# Altium schematic symbol library FPGA_Xilinx_Virtex6.SchLib: 28 symbols (part 16 of 21)
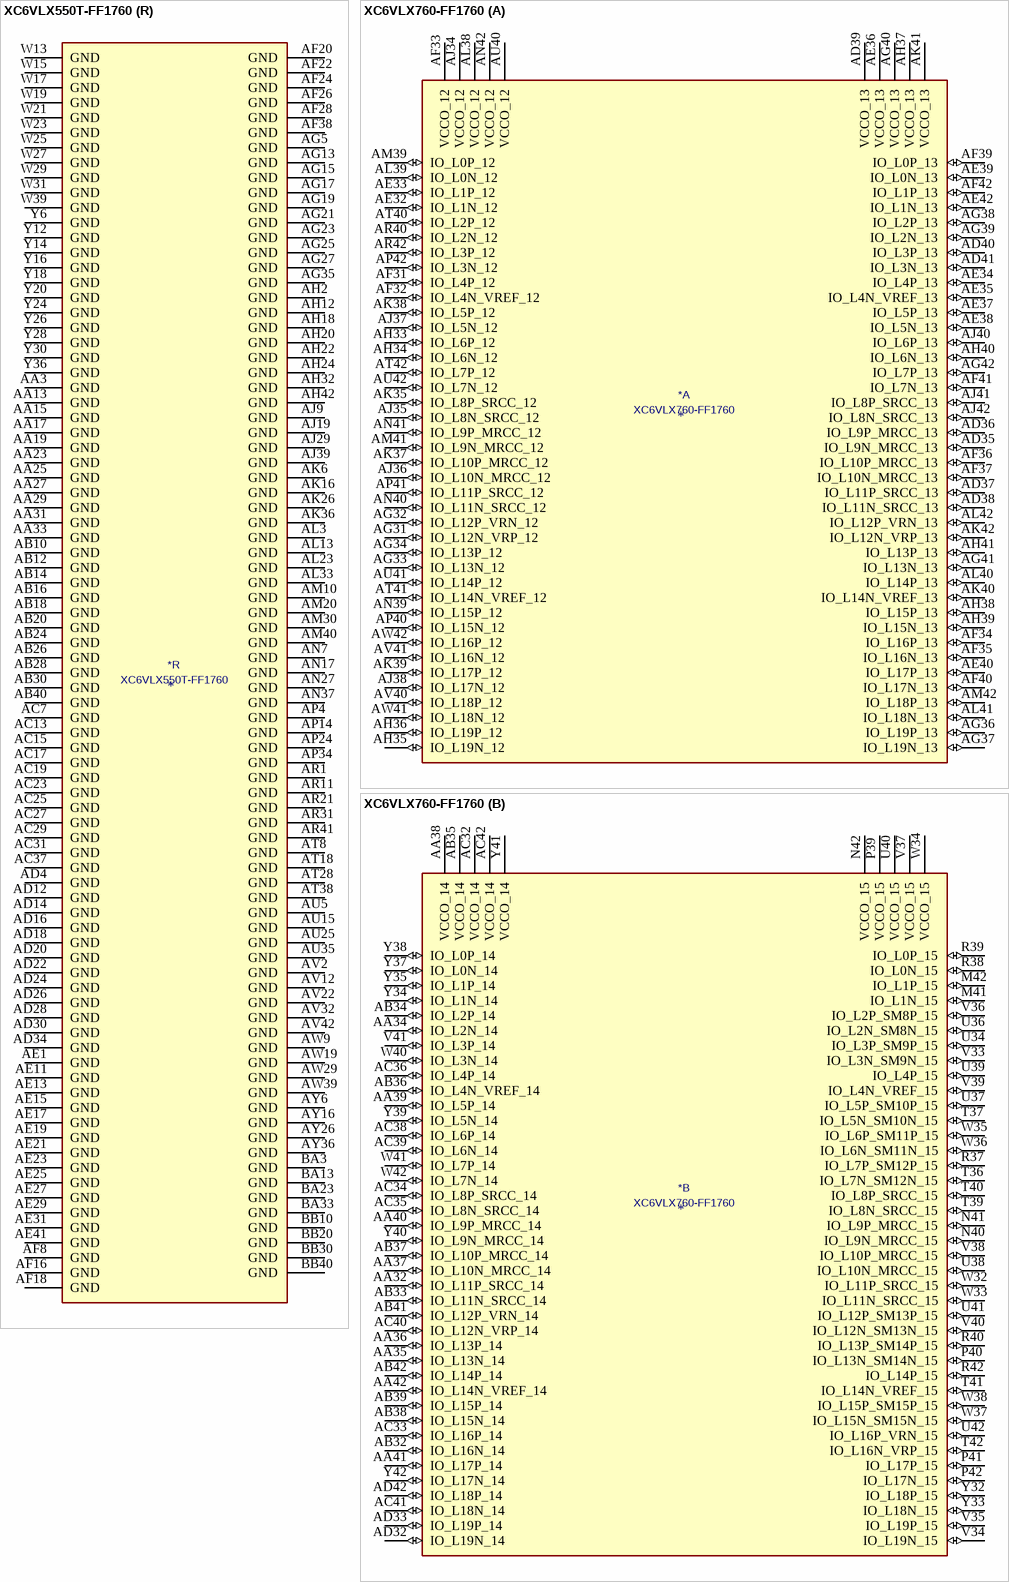
[diagram p116: symbols XC6VLX550T-FF1760 to XC6VLX760-FF1760]

## XC6VLX550T-FF1760
designator *  value XC6VLX550T-FF1760
ki_keywords: FPGA; ki_description: Virtex 6 LXT 550 XC6VLX550T-FF1760
part A pins: AD35 IO_L9N_MRCC_13 (io), AD36 IO_L9P_MRCC_13 (io), AD37 IO_L11P_SRCC_13 (io), AD38 IO_L11N_SRCC_13 (io), AD39 VCCO_13 (power), AD40 IO_L3P_13 (io), AD41 IO_L3N_13 (io), AE32 IO_L1N_12 (io), AE33 IO_L1P_12 (io), AE34 IO_L4P_13 (io), AE35 IO_L4N_VREF_13 (io), AE36 VCCO_13 (power), AE37 IO_L5P_13 (io), AE38 IO_L5N_13 (io), AE39 IO_L0N_13 (io), AE40 IO_L17P_13 (io), AE42 IO_L1N_13 (io), AF31 IO_L4P_12 (io), AF32 IO_L4N_VREF_12 (io), AF33 VCCO_12 (power), AF34 IO_L16P_13 (io), AF35 IO_L16N_13 (io), AF36 IO_L10P_MRCC_13 (io), AF37 IO_L10N_MRCC_13 (io), AF39 IO_L0P_13 (io), AF40 IO_L17N_13 (io), AF41 IO_L7N_13 (io), AF42 IO_L1P_13 (io), AG31 IO_L12N_VRP_12 (io), AG32 IO_L12P_VRN_12 (io), AG33 IO_L13N_12 (io), AG34 IO_L13P_12 (io), AG36 IO_L19P_13 (io), AG37 IO_L19N_13 (io), AG38 IO_L2P_13 (io), AG39 IO_L2N_13 (io), AG40 VCCO_13 (power), AG41 IO_L13N_13 (io), AG42 IO_L7P_13 (io), AH33 IO_L6P_12 (io), AH34 IO_L6N_12 (io), AH35 IO_L19N_12 (io), AH36 IO_L19P_12 (io), AH37 VCCO_13 (power), AH38 IO_L15P_13 (io), AH39 IO_L15N_13 (io), AH40 IO_L6N_13 (io), AH41 IO_L13P_13 (io), AJ34 VCCO_12 (power), AJ35 IO_L8N_SRCC_12 (io), AJ36 IO_L10N_MRCC_12 (io), AJ37 IO_L5N_12 (io), AJ38 IO_L17N_12 (io), AJ40 IO_L6P_13 (io), AJ41 IO_L8P_SRCC_13 (io), AJ42 IO_L8N_SRCC_13 (io), AK35 IO_L8P_SRCC_12 (io), AK37 IO_L10P_MRCC_12 (io), AK38 IO_L5P_12 (io), AK39 IO_L17P_12 (io), AK40 IO_L14N_VREF_13 (io), AK41 VCCO_13 (power), AK42 IO_L12N_VRP_13 (io), AL38 VCCO_12 (power), AL39 IO_L0N_12 (io), AL40 IO_L14P_13 (io), AL41 IO_L18N_13 (io), AL42 IO_L12P_VRN_13 (io), AM39 IO_L0P_12 (io), AM41 IO_L9N_MRCC_12 (io), AM42 IO_L18P_13 (io), AN39 IO_L15P_12 (io), AN40 IO_L11N_SRCC_12 (io), AN41 IO_L9P_MRCC_12 (io), AN42 VCCO_12 (power), AP40 IO_L15N_12 (io), AP41 IO_L11P_SRCC_12 (io), AP42 IO_L3N_12 (io), AR40 IO_L2N_12 (io), AR42 IO_L3P_12 (io), AT40 IO_L2P_12 (io), AT41 IO_L14N_VREF_12 (io), AT42 IO_L7P_12 (io), AU40 VCCO_12 (power), AU41 IO_L14P_12 (io), AU42 IO_L7N_12 (io), AV40 IO_L18P_12 (io), AV41 IO_L16N_12 (io), AW41 IO_L18N_12 (io), AW42 IO_L16P_12 (io)
part B pins: AA32 IO_L11P_SRCC_14 (io), AA34 IO_L2N_14 (io), AA35 IO_L13N_14 (io), AA36 IO_L13P_14 (io), AA37 IO_L10N_MRCC_14 (io), AA38 VCCO_14 (power), AA39 IO_L5P_14 (io), AA40 IO_L9P_MRCC_14 (io), AA41 IO_L17P_14 (io), AA42 IO_L14N_VREF_14 (io), AB32 IO_L16N_14 (io), AB33 IO_L11N_SRCC_14 (io), AB34 IO_L2P_14 (io), AB35 VCCO_14 (power), AB36 IO_L4N_VREF_14 (io), AB37 IO_L10P_MRCC_14 (io), AB38 IO_L15N_14 (io), AB39 IO_L15P_14 (io), AB41 IO_L12P_VRN_14 (io), AB42 IO_L14P_14 (io), AC32 VCCO_14 (power), AC33 IO_L16P_14 (io), AC34 IO_L8P_SRCC_14 (io), AC35 IO_L8N_SRCC_14 (io), AC36 IO_L4P_14 (io), AC38 IO_L6P_14 (io), AC39 IO_L6N_14 (io), AC40 IO_L12N_VRP_14 (io), AC41 IO_L18N_14 (io), AC42 VCCO_14 (power), AD32 IO_L19N_14 (io), AD33 IO_L19P_14 (io), AD42 IO_L18P_14 (io), M41 IO_L1N_15 (io), M42 IO_L1P_15 (io), N40 IO_L9N_MRCC_15 (io), N41 IO_L9P_MRCC_15 (io), N42 VCCO_15 (power), P39 VCCO_15 (power), P40 IO_L13N_SM14N_15 (io), P41 IO_L17P_15 (io), P42 IO_L17N_15 (io), R37 IO_L7P_SM12P_15 (io), R38 IO_L0N_15 (io), R39 IO_L0P_15 (io), R40 IO_L13P_SM14P_15 (io), R42 IO_L14P_15 (io), T36 IO_L7N_SM12N_15 (io), T37 IO_L5N_SM10N_15 (io), T39 IO_L8N_SRCC_15 (io), T40 IO_L8P_SRCC_15 (io), T41 IO_L14N_VREF_15 (io), T42 IO_L16N_VRP_15 (io), U34 IO_L3P_SM9P_15 (io), U36 IO_L2N_SM8N_15 (io), U37 IO_L5P_SM10P_15 (io), U38 IO_L10N_MRCC_15 (io), U39 IO_L4P_15 (io), U40 VCCO_15 (power), U41 IO_L12P_SM13P_15 (io), U42 IO_L16P_VRN_15 (io), V33 IO_L3N_SM9N_15 (io), V34 IO_L19N_15 (io), V35 IO_L19P_15 (io), V36 IO_L2P_SM8P_15 (io), V37 VCCO_15 (power), V38 IO_L10P_MRCC_15 (io), V39 IO_L4N_VREF_15 (io), V40 IO_L12N_SM13N_15 (io), V41 IO_L3P_14 (io), W32 IO_L11P_SRCC_15 (io), W33 IO_L11N_SRCC_15 (io), W34 VCCO_15 (power), W35 IO_L6P_SM11P_15 (io), W36 IO_L6N_SM11N_15 (io), W37 IO_L15N_SM15N_15 (io), W38 IO_L15P_SM15P_15 (io), W40 IO_L3N_14 (io), W41 IO_L7P_14 (io), W42 IO_L7N_14 (io), Y32 IO_L18P_15 (io), Y33 IO_L18N_15 (io), Y34 IO_L1N_14 (io), Y35 IO_L1P_14 (io), Y37 IO_L0N_14 (io), Y38 IO_L0P_14 (io), Y39 IO_L5N_14 (io), Y40 IO_L9N_MRCC_14 (io), Y41 VCCO_14 (power), Y42 IO_L17N_14 (io)
part C pins: A40 IO_L3N_17 (io), A41 IO_L3P_17 (io), B39 IO_L1P_17 (io), B41 IO_L7P_17 (io), B42 IO_L7N_17 (io), C39 IO_L1N_17 (io), C40 IO_L9N_MRCC_17 (io), C41 IO_L9P_MRCC_17 (io), C42 VCCO_17 (power), D39 VCCO_17 (power), D40 IO_L14P_17 (io), D41 IO_L16N_17 (io), D42 IO_L16P_17 (io), E38 IO_L5N_17 (io), E39 IO_L5P_17 (io), E40 IO_L14N_VREF_17 (io), E42 IO_L18N_17 (io), F39 IO_L2N_17 (io), F40 IO_L2P_17 (io), F41 IO_L18P_17 (io), F42 IO_L13N_16 (io), G37 IO_L0P_17 (io), G38 IO_L4N_VREF_17 (io), G39 IO_L12N_VRP_17 (io), G40 VCCO_16 (power), G41 IO_L11N_SRCC_16 (io), G42 IO_L13P_16 (io), H36 IO_L0N_17 (io), H37 VCCO_17 (power), H38 IO_L4P_17 (io), H39 IO_L12P_VRN_17 (io), H40 IO_L11P_SRCC_16 (io), H41 IO_L19N_16 (io), J34 VCCO_17 (power), J35 IO_L17N_17 (io), J36 IO_L19P_17 (io), J37 IO_L10N_MRCC_17 (io), J38 IO_L10P_MRCC_17 (io), J40 IO_L9P_MRCC_16 (io), J41 IO_L16N_16 (io), J42 IO_L19P_16 (io), K34 IO_L17P_17 (io), K35 IO_L19N_17 (io), K37 IO_L15P_17 (io), K38 IO_L0P_16 (io), K39 IO_L9N_MRCC_16 (io), K40 IO_L6N_16 (io), K41 VCCO_16 (power), K42 IO_L16P_16 (io), L34 IO_L11N_SRCC_17 (io), L35 IO_L6P_17 (io), L36 IO_L15N_17 (io), L37 IO_L0N_16 (io), L38 VCCO_16 (power), L39 IO_L4N_VREF_16 (io), L40 IO_L6P_16 (io), L41 IO_L18N_16 (io), L42 IO_L18P_16 (io), M33 IO_L11P_SRCC_17 (io), M34 IO_L6N_17 (io), M35 VCCO_17 (power), M36 IO_L3P_16 (io), M37 IO_L10N_MRCC_16 (io), M38 IO_L10P_MRCC_16 (io), M39 IO_L4P_16 (io), N32 VCCO_17 (power), N33 IO_L13P_17 (io), N34 IO_L8N_SRCC_17 (io), N35 IO_L3N_16 (io), N36 IO_L5N_16 (io), N38 IO_L12N_VRP_16 (io), N39 IO_L12P_VRN_16 (io), P32 IO_L13N_17 (io), P33 IO_L8P_SRCC_17 (io), P35 IO_L17N_16 (io), P36 IO_L5P_16 (io), P37 IO_L15N_16 (io), P38 IO_L15P_16 (io), R32 IO_L1N_16 (io), R33 IO_L1P_16 (io), R34 IO_L17P_16 (io), R35 IO_L2N_16 (io), R36 VCCO_16 (power), T31 IO_L7P_16 (io), T32 IO_L7N_16 (io), T33 VCCO_16 (power), T34 IO_L8N_SRCC_16 (io), T35 IO_L2P_16 (io), U31 IO_L14P_16 (io), U32 IO_L14N_VREF_16 (io), U33 IO_L8P_SRCC_16 (io)
part D pins: AH26 IO_L4N_VREF_21 (io), AJ22 IO_L8N_SRCC_21 (io), AJ23 IO_L8P_SRCC_21 (io), AJ24 VCCO_21 (power), AJ25 IO_L12N_VRP_21 (io), AJ26 IO_L4P_21 (io), AK22 IO_L16N_21 (io), AK23 IO_L16P_21 (io), AK24 IO_L19P_21 (io), AK25 IO_L12P_VRN_21 (io), AL24 IO_L15P_21 (io), AL25 IO_L19N_21 (io), AM23 IO_L18P_21 (io), AM24 IO_L15N_21 (io), AM25 VCCO_21 (power), AM26 IO_L17N_21 (io), AN23 IO_L18N_21 (io), AN24 IO_L14P_21 (io), AN25 IO_L14N_VREF_21 (io), AN26 IO_L17P_21 (io), AP23 IO_L11P_SRCC_20 (io), AP25 IO_L9P_MRCC_20 (io), AP26 IO_L13P_21 (io), AP27 IO_L13N_21 (io), AR23 IO_L11N_SRCC_20 (io), AR24 IO_L2P_20 (io), AR25 IO_L9N_MRCC_20 (io), AR26 VCCO_21 (power), AR27 IO_L11N_SRCC_21 (io), AT22 IO_L10P_MRCC_20 (io), AT23 VCCO_20 (power), AT24 IO_L15P_20 (io), AT25 IO_L2N_20 (io), AT26 IO_L10N_MRCC_21 (io), AT27 IO_L11P_SRCC_21 (io), AU22 IO_L10N_MRCC_20 (io), AU23 IO_L19P_20 (io), AU24 IO_L15N_20 (io), AU26 IO_L10P_MRCC_21 (io), AU27 IO_L5P_21 (io), AU28 IO_L5N_21 (io), AU29 IO_L0P_21 (io), AV23 IO_L19N_20 (io), AV24 IO_L5P_20 (io), AV25 IO_L0N_20 (io), AV26 IO_L0P_20 (io), AV27 VCCO_21 (power), AV28 IO_L6N_21 (io), AV29 IO_L0N_21 (io), AW22 IO_L6P_20 (io), AW23 IO_L6N_20 (io), AW24 VCCO_20 (power), AW25 IO_L5N_20 (io), AW26 IO_L1N_20 (io), AW27 IO_L6P_21 (io), AW28 IO_L9P_MRCC_21 (io), AW30 IO_L2N_21 (io), AY21 VCCO_20 (power), AY22 IO_L16P_20 (io), AY23 IO_L16N_20 (io), AY24 IO_L8N_SRCC_20 (io), AY25 IO_L4N_VREF_20 (io), AY27 IO_L1P_20 (io), AY28 IO_L3N_20 (io), AY29 IO_L9N_MRCC_21 (io), AY30 IO_L2P_21 (io), AY31 VCCO_21 (power), AY32 IO_L1N_21 (io), BA21 IO_L12P_VRN_20 (io), BA22 IO_L18P_20 (io), BA24 IO_L8P_SRCC_20 (io), BA25 IO_L4P_20 (io), BA26 IO_L13N_20 (io), BA27 IO_L17N_20 (io), BA28 VCCO_20 (power), BA29 IO_L3P_20 (io), BA30 IO_L7N_21 (io), BA31 IO_L3P_21 (io), BA32 IO_L1P_21 (io), BB21 IO_L12N_VRP_20 (io), BB22 IO_L18N_20 (io), BB23 IO_L14P_20 (io), BB24 IO_L14N_VREF_20 (io), BB25 VCCO_20 (power), BB26 IO_L13P_20 (io), BB27 IO_L17P_20 (io), BB28 IO_L7N_20 (io), BB29 IO_L7P_20 (io), BB31 IO_L7P_21 (io), BB32 IO_L3N_21 (io)
part E pins: AJ27 IO_L19N_22 (io), AJ28 IO_L0P_22 (io), AK27 IO_L19P_22 (io), AK28 IO_L0N_22 (io), AL26 IO_L18P_22 (io), AL27 IO_L16P_22 (io), AL28 VCCO_22 (power), AM27 IO_L18N_22 (io), AM28 IO_L16N_22 (io), AM29 IO_L17P_22 (io), AM31 IO_L6P_23 (io), AM32 IO_L6N_23 (io), AN28 IO_L14P_22 (io), AN29 IO_L17N_22 (io), AN30 IO_L18P_23 (io), AN31 IO_L18N_23 (io), AN32 VCCO_23 (power), AN33 IO_L13N_23 (io), AP28 IO_L14N_VREF_22 (io), AP29 VCCO_22 (power), AP30 IO_L7N_22 (io), AP31 IO_L7P_22 (io), AP32 IO_L16P_23 (io), AP33 IO_L13P_23 (io), AR28 IO_L13P_22 (io), AR29 IO_L11N_SRCC_22 (io), AR30 IO_L9P_MRCC_22 (io), AR32 IO_L16N_23 (io), AR33 IO_L14P_23 (io), AR34 IO_L17N_23 (io), AT29 IO_L13N_22 (io), AT30 IO_L11P_SRCC_22 (io), AT31 IO_L9N_MRCC_22 (io), AT32 IO_L4P_22 (io), AT33 VCCO_23 (power), AT34 IO_L14N_VREF_23 (io), AT35 IO_L17P_23 (io), AU30 VCCO_22 (power), AU31 IO_L15N_22 (io), AU32 IO_L6N_22 (io), AU33 IO_L4N_VREF_22 (io), AU34 IO_L5N_22 (io), AU36 IO_L10P_MRCC_23 (io), AU37 IO_L10N_MRCC_23 (io), AU38 IO_L5N_23 (io), AU39 IO_L0P_23 (io), AV30 IO_L12P_VRN_22 (io), AV31 IO_L15P_22 (io), AV33 IO_L6P_22 (io), AV34 IO_L5P_22 (io), AV35 IO_L19N_23 (io), AV36 IO_L15P_23 (io), AV37 VCCO_23 (power), AV38 IO_L5P_23 (io), AV39 IO_L0N_23 (io), AW31 IO_L12N_VRP_22 (io), AW32 IO_L10P_MRCC_22 (io), AW33 IO_L10N_MRCC_22 (io), AW34 VCCO_22 (power), AW35 IO_L2N_22 (io), AW36 IO_L19P_23 (io), AW37 IO_L15N_23 (io), AW38 IO_L2N_23 (io), AW40 IO_L1N_23 (io), AY33 IO_L8P_SRCC_22 (io), AY34 IO_L8N_SRCC_22 (io), AY35 IO_L2P_22 (io), AY37 IO_L4N_VREF_23 (io), AY38 IO_L2P_23 (io), AY39 IO_L9N_MRCC_23 (io), AY40 IO_L1P_23 (io), AY41 VCCO_23 (power), AY42 IO_L3N_23 (io), BA34 IO_L1P_22 (io), BA35 IO_L1N_22 (io), BA36 IO_L12N_VRP_23 (io), BA37 IO_L4P_23 (io), BA38 VCCO_23 (power), BA39 IO_L9P_MRCC_23 (io), BA40 IO_L11P_SRCC_23 (io), BA41 IO_L7P_23 (io), BA42 IO_L3P_23 (io), BB33 IO_L3P_22 (io), BB34 IO_L3N_22 (io), BB35 VCCO_22 (power), BB36 IO_L12P_VRN_23 (io), BB37 IO_L8P_SRCC_23 (io), BB38 IO_L8N_SRCC_23 (io), BB39 IO_L11N_SRCC_23 (io), BB41 IO_L7N_23 (io)
part F pins: A36 IO_L7P_25 (io), A37 IO_L9N_MRCC_25 (io), A38 VCCO_25 (power), A39 IO_L18P_GC_25 (io), AG30 VCCO_24 (power), AH29 IO_L18P_24 (io), AH30 IO_L11N_SRCC_24 (io), AH31 IO_L2N_D14_24 (io), AJ30 IO_L18N_24 (io), AJ31 IO_L11P_SRCC_24 (io), AJ32 IO_L2P_D15_24 (io), AJ33 IO_L4N_VREF_D10_24 (io), AK29 IO_L19N_24 (io), AK30 IO_L16P_RS0_24 (io), AK31 VCCO_24 (power), AK32 IO_L17N_VRP_24 (io), AK33 IO_L17P_VRN_24 (io), AK34 IO_L4P_D11_24 (io), AL29 IO_L19P_24 (io), AL30 IO_L16N_CSO_B_24 (io), AL31 IO_L14P_FCS_B_24 (io), AL32 IO_L14N_VREF_FOE_B_MOSI_24 (io), AL34 IO_L7N_D4_24 (io), AL35 IO_L7P_D5_24 (io), AL36 IO_L0P_GC_24 (io), AL37 IO_L0N_GC_24 (io), AM33 IO_L13P_D1_FS1_24 (io), AM34 IO_L13N_D0_FS0_24 (io), AM35 VCCO_24 (power), AM36 IO_L5P_D9_24 (io), AM37 IO_L5N_D8_24 (io), AM38 IO_L6N_D6_24 (io), AN34 IO_L12P_D3_24 (io), AN35 IO_L12N_D2_FS2_24 (io), AN36 IO_L10N_MRCC_24 (io), AN38 IO_L6P_D7_24 (io), AP35 IO_L15P_FWE_B_24 (io), AP36 IO_L15N_RS1_24 (io), AP37 IO_L10P_MRCC_24 (io), AP38 IO_L1N_GC_24 (io), AP39 VCCO_24 (power), AR35 IO_L8P_SRCC_24 (io), AR36 VCCO_24 (power), AR37 IO_L9N_MRCC_24 (io), AR38 IO_L1P_GC_24 (io), AR39 IO_L3N_D12_24 (io), AT36 IO_L8N_SRCC_24 (io), AT37 IO_L9P_MRCC_24 (io), AT39 IO_L3P_D13_24 (io), B36 IO_L7N_25 (io), B37 IO_L9P_MRCC_25 (io), B38 IO_L18N_GC_25 (io), C36 IO_L11P_SRCC_25 (io), C38 IO_L5N_25 (io), D36 IO_L16P_VRN_25 (io), D37 IO_L11N_SRCC_25 (io), D38 IO_L5P_25 (io), E35 IO_L16N_VRP_25 (io), E36 VCCO_25 (power), E37 IO_L15N_25 (io), F33 VCCO_25 (power), F34 IO_L0P_25 (io), F35 IO_L0N_25 (io), F36 IO_L10N_MRCC_25 (io), F37 IO_L15P_25 (io), G34 IO_L12P_25 (io), G36 IO_L10P_MRCC_25 (io), H33 IO_L12N_25 (io), H34 IO_L6N_25 (io), H35 IO_L6P_25 (io), J32 IO_L8N_SRCC_25 (io), J33 IO_L14N_VREF_25 (io), K31 VCCO_25 (power), K32 IO_L8P_SRCC_25 (io), K33 IO_L14P_25 (io), L30 IO_L4N_VREF_25 (io), L31 IO_L4P_25 (io), L32 IO_L13N_25 (io), M29 IO_L3P_25 (io), M31 IO_L13P_25 (io), M32 IO_L19N_GC_25 (io), N28 IO_L3N_25 (io), N29 IO_L2N_25 (io), N30 IO_L17P_25 (io), N31 IO_L19P_GC_25 (io), P28 IO_L1N_25 (io), P29 VCCO_25 (power), P30 IO_L2P_25 (io), P31 IO_L17N_25 (io), R28 IO_L1P_25 (io)
part G pins: A28 VCCO_27 (power), A29 IO_L16N_27 (io), A30 IO_L16P_27 (io), A31 IO_L18P_27 (io), A32 IO_L7P_26 (io), A34 IO_L9N_MRCC_26 (io), A35 IO_L9P_MRCC_26 (io), B28 IO_L11P_SRCC_27 (io), B29 IO_L11N_SRCC_27 (io), B31 IO_L18N_27 (io), B32 IO_L7N_26 (io), B33 IO_L11P_SRCC_26 (io), B34 IO_L18N_26 (io), B35 VCCO_26 (power), C28 IO_L13N_27 (io), C29 IO_L13P_27 (io), C30 IO_L14N_VREF_27 (io), C31 IO_L14P_27 (io), C32 VCCO_26 (power), C33 IO_L15P_26 (io), C34 IO_L11N_SRCC_26 (io), C35 IO_L18P_26 (io), D28 IO_L10P_MRCC_27 (io), D29 VCCO_27 (power), D30 IO_L15P_27 (io), D31 IO_L19P_27 (io), D32 IO_L15N_26 (io), D33 IO_L10P_MRCC_26 (io), D35 IO_L19P_26 (io), E28 IO_L10N_MRCC_27 (io), E29 IO_L15N_27 (io), E30 IO_L19N_27 (io), E32 IO_L6P_26 (io), E33 IO_L10N_MRCC_26 (io), E34 IO_L19N_26 (io), F27 IO_L5N_27 (io), F29 IO_L6N_27 (io), F30 IO_L5N_26 (io), F31 IO_L5P_26 (io), F32 IO_L6N_26 (io), G26 IO_L3N_27 (io), G27 IO_L3P_27 (io), G28 IO_L5P_27 (io), G29 IO_L6P_27 (io), G30 VCCO_26 (power), G31 IO_L14P_26 (io), G32 IO_L16N_26 (io), G33 IO_L16P_26 (io), H26 IO_L7P_27 (io), H27 VCCO_27 (power), H28 IO_L12P_VRN_27 (io), H29 IO_L17P_26 (io), H30 IO_L17N_26 (io), H31 IO_L14N_VREF_26 (io), J26 IO_L7N_27 (io), J27 IO_L12N_VRP_27 (io), J28 IO_L13N_26 (io), J30 IO_L4P_26 (io), J31 IO_L8N_SRCC_26 (io), K27 IO_L17N_27 (io), K28 IO_L13P_26 (io), K29 IO_L4N_VREF_26 (io), K30 IO_L8P_SRCC_26 (io), L25 IO_L0P_27 (io), L26 IO_L17P_27 (io), L27 IO_L3P_26 (io), L28 VCCO_26 (power), L29 IO_L12N_VRP_26 (io), M21 IO_L2N_27 (io), M22 IO_L2P_27 (io), M23 IO_L4N_VREF_27 (io), M24 IO_L0N_27 (io), M25 VCCO_27 (power), M26 IO_L1N_27 (io), M27 IO_L3N_26 (io), M28 IO_L12P_VRN_26 (io), N21 IO_L8P_SRCC_27 (io), N22 VCCO_27 (power), N23 IO_L4P_27 (io), N24 IO_L9N_MRCC_27 (io), N25 IO_L1P_27 (io), N26 IO_L1N_26 (io), P22 IO_L8N_SRCC_27 (io), P23 IO_L9P_MRCC_27 (io), P25 IO_L2P_26 (io), P26 IO_L1P_26 (io), P27 IO_L0P_26 (io), R25 IO_L2N_26 (io), R26 VCCO_26 (power), R27 IO_L0N_26 (io)
part H pins: A22 IO_L9N_MRCC_28 (io), A24 IO_L16N_28 (io), A25 IO_L16P_28 (io), A26 IO_L18N_28 (io), A27 IO_L18P_28 (io), AL22 IO_L10N_MRCC_30 (io), AM21 IO_L15N_30 (io), AM22 IO_L10P_MRCC_30 (io), AN20 IO_L16P_30 (io), AN21 IO_L15P_30 (io), AN22 VCCO_30 (power), AP20 IO_L16N_30 (io), AP21 IO_L18P_30 (io), AP22 IO_L13N_30 (io), AR19 IO_L1N_30 (io), AR20 IO_L18N_30 (io), AR22 IO_L13P_30 (io), AT19 IO_L1P_30 (io), AT20 IO_L17N_30 (io), AT21 IO_L17P_30 (io), AU18 IO_L0P_30 (io), AU19 IO_L5P_30 (io), AU20 VCCO_30 (power), AU21 IO_L19P_30 (io), AV17 VCCO_30 (power), AV18 IO_L0N_30 (io), AV19 IO_L5N_30 (io), AV20 IO_L6P_30 (io), AV21 IO_L19N_30 (io), AW17 IO_L8N_SRCC_30 (io), AW18 IO_L12N_VRP_30 (io), AW20 IO_L6N_30 (io), AW21 IO_L11P_SRCC_30 (io), AY17 IO_L8P_SRCC_30 (io), AY18 IO_L12P_VRN_30 (io), AY19 IO_L14P_30 (io), AY20 IO_L11N_SRCC_30 (io), B22 IO_L9P_MRCC_28 (io), B23 IO_L11N_SRCC_28 (io), B24 IO_L1P_28 (io), B25 VCCO_28 (power), B26 IO_L12P_VRN_28 (io), B27 IO_L14P_28 (io), BA14 IO_L2N_30 (io), BA15 IO_L4N_VREF_30 (io), BA16 IO_L3N_30 (io), BA17 IO_L3P_30 (io), BA18 VCCO_30 (power), BA19 IO_L14N_VREF_30 (io), BA20 IO_L9P_MRCC_30 (io), BB14 IO_L2P_30 (io), BB15 VCCO_30 (power), BB16 IO_L4P_30 (io), BB17 IO_L7P_30 (io), BB18 IO_L7N_30 (io), BB19 IO_L9N_MRCC_30 (io), C22 VCCO_28 (power), C23 IO_L11P_SRCC_28 (io), C24 IO_L1N_28 (io), C25 IO_L12N_VRP_28 (io), C26 IO_L14N_VREF_28 (io), D22 IO_L0N_28 (io), D23 IO_L5N_28 (io), D25 IO_L15N_28 (io), D26 IO_L15P_28 (io), D27 IO_L19N_28 (io), E22 IO_L0P_28 (io), E23 IO_L5P_28 (io), E24 IO_L6P_28 (io), E25 IO_L6N_28 (io), E26 VCCO_28 (power), E27 IO_L19P_28 (io), F22 IO_L13P_28 (io), F23 VCCO_28 (power), F24 IO_L3N_28 (io), F25 IO_L10N_MRCC_28 (io), F26 IO_L10P_MRCC_28 (io), G22 IO_L13N_28 (io), G23 IO_L17P_28 (io), G24 IO_L3P_28 (io), H23 IO_L17N_28 (io), H24 IO_L7P_28 (io), H25 IO_L7N_28 (io), J23 IO_L8N_SRCC_28 (io), J24 VCCO_28 (power), J25 IO_L2N_28 (io), K23 IO_L8P_SRCC_28 (io), K24 IO_L2P_28 (io), K25 IO_L4N_VREF_28 (io), L24 IO_L4P_28 (io)
part I pins: AJ17 IO_L15N_32 (io), AJ18 IO_L7N_32 (io), AJ20 IO_L6P_31 (io), AJ21 IO_L10N_MRCC_31 (io), AK15 IO_L2N_32 (io), AK17 IO_L15P_32 (io), AK18 IO_L7P_32 (io), AK19 IO_L6N_31 (io), AK20 IO_L10P_MRCC_31 (io), AK21 VCCO_31 (power), AL15 IO_L2P_32 (io), AL16 IO_L14N_VREF_32 (io), AL17 IO_L19N_32 (io), AL18 VCCO_32 (power), AL19 IO_L16P_31 (io), AL20 IO_L18N_31 (io), AL21 IO_L18P_31 (io), AM15 VCCO_32 (power), AM16 IO_L14P_32 (io), AM17 IO_L19P_32 (io), AM18 IO_L16N_31 (io), AM19 IO_L3N_31 (io), AN15 IO_L18N_32 (io), AN16 IO_L1N_32 (io), AN18 IO_L1N_31 (io), AN19 IO_L3P_31 (io), AP15 IO_L18P_32 (io), AP16 IO_L1P_32 (io), AP17 IO_L7P_31 (io), AP18 IO_L1P_31 (io), AP19 VCCO_31 (power), AR12 IO_L16N_32 (io), AR13 IO_L3N_32 (io), AR14 IO_L3P_32 (io), AR15 IO_L9N_MRCC_32 (io), AR16 VCCO_31 (power), AR17 IO_L7N_31 (io), AR18 IO_L9N_MRCC_31 (io), AT10 IO_L4P_32 (io), AT11 IO_L4N_VREF_32 (io), AT12 IO_L16P_32 (io), AT13 VCCO_32 (power), AT14 IO_L9P_MRCC_32 (io), AT15 IO_L14N_VREF_31 (io), AT16 IO_L14P_31 (io), AT17 IO_L9P_MRCC_31 (io), AU9 IO_L0P_32 (io), AU10 VCCO_32 (power), AU11 IO_L5P_32 (io), AU12 IO_L6P_32 (io), AU13 IO_L10N_MRCC_32 (io), AU14 IO_L10P_MRCC_32 (io), AU16 IO_L5P_31 (io), AU17 IO_L19P_31 (io), AV8 IO_L8N_SRCC_32 (io), AV9 IO_L0N_32 (io), AV10 IO_L5N_32 (io), AV11 IO_L6N_32 (io), AV13 IO_L0P_31 (io), AV14 IO_L0N_31 (io), AV15 IO_L5N_31 (io), AV16 IO_L19N_31 (io), AW8 IO_L8P_SRCC_32 (io), AW10 IO_L11P_SRCC_32 (io), AW11 IO_L2P_31 (io), AW12 IO_L12N_VRP_31 (io), AW13 IO_L12P_VRN_31 (io), AW14 VCCO_31 (power), AW15 IO_L15N_31 (io), AW16 IO_L15P_31 (io), AY8 IO_L12P_VRN_32 (io), AY9 IO_L11N_SRCC_32 (io), AY10 IO_L2N_31 (io), AY11 VCCO_31 (power), AY12 IO_L11P_SRCC_31 (io), AY13 IO_L11N_SRCC_31 (io), AY14 IO_L13N_31 (io), AY15 IO_L13P_31 (io), BA7 IO_L12N_VRP_32 (io), BA8 VCCO_32 (power), BA9 IO_L13N_32 (io), BA10 IO_L4N_VREF_31 (io), BA11 IO_L4P_31 (io), BA12 IO_L8P_SRCC_31 (io), BB7 IO_L17P_32 (io), BB8 IO_L17N_32 (io), BB9 IO_L13P_32 (io), BB11 IO_L8N_SRCC_31 (io), BB12 IO_L17P_31 (io), BB13 IO_L17N_31 (io)
part J pins: AH11 IO_L0P_GC_34 (io), AH16 IO_L6N_33 (io), AJ10 IO_L0N_GC_34 (io), AJ11 IO_L13N_A00_D16_34 (io), AJ12 IO_L16N_A20_34 (io), AJ13 IO_L2N_33 (io), AJ14 VCCO_33 (power), AJ15 IO_L5N_33 (io), AJ16 IO_L6P_33 (io), AK8 IO_L2N_A14_D30_34 (io), AK9 IO_L11P_SRCC_34 (io), AK10 IO_L13P_A01_D17_34 (io), AK11 VCCO_34 (power), AK12 IO_L16P_A21_34 (io), AK13 IO_L2P_33 (io), AK14 IO_L5P_33 (io), AL7 IO_L2P_A15_D31_34 (io), AL8 VCCO_34 (power), AL9 IO_L11N_SRCC_34 (io), AL10 IO_L17N_A18_34 (io), AL11 IO_L18N_A16_34 (io), AL12 IO_L18P_A17_34 (io), AL14 IO_L18N_33 (io), AM7 IO_L5N_A08_D24_34 (io), AM8 IO_L19N_VRP_34 (io), AM9 IO_L17P_A19_34 (io), AM11 IO_L1N_33 (io), AM12 IO_L14P_33 (io), AM13 IO_L16P_33 (io), AM14 IO_L18P_33 (io), AN6 IO_L5P_A09_D25_34 (io), AN8 IO_L19P_VRN_34 (io), AN9 IO_L4N_VREF_33 (io), AN10 IO_L1P_33 (io), AN11 IO_L14N_VREF_33 (io), AN12 VCCO_33 (power), AN13 IO_L16N_33 (io), AN14 IO_L17P_33 (io), AP5 IO_L6N_A06_D22_34 (io), AP6 IO_L15N_A22_34 (io), AP7 IO_L15P_A23_34 (io), AP8 IO_L4P_33 (io), AP9 VCCO_33 (power), AP10 IO_L3N_33 (io), AP11 IO_L7P_33 (io), AP12 IO_L7N_33 (io), AP13 IO_L17N_33 (io), AR5 IO_L6P_A07_D23_34 (io), AR6 VCCO_34 (power), AR7 IO_L8N_SRCC_33 (io), AR8 IO_L0N_33 (io), AR9 IO_L9N_MRCC_33 (io), AR10 IO_L3P_33 (io), AT4 IO_L14N_VREF_A24_34 (io), AT5 IO_L14P_A25_34 (io), AT6 IO_L8P_SRCC_33 (io), AT7 IO_L0P_33 (io), AT9 IO_L9P_MRCC_33 (io), AU4 IO_L4P_A11_D27_34 (io), AU6 IO_L10N_MRCC_33 (io), AU7 IO_L19N_33 (io), AU8 IO_L19P_33 (io), AV3 IO_L4N_VREF_A10_D26_34 (io), AV4 IO_L10N_MRCC_34 (io), AV5 IO_L10P_MRCC_34 (io), AV6 IO_L10P_MRCC_33 (io), AV7 VCCO_33 (power), AW1 IO_L1N_GC_34 (io), AW2 IO_L1P_GC_34 (io), AW3 IO_L9N_MRCC_34 (io), AW4 VCCO_34 (power), AW5 IO_L15N_33 (io), AW6 IO_L15P_33 (io), AW7 IO_L11P_SRCC_33 (io), AY1 VCCO_34 (power), AY2 IO_L3P_A13_D29_34 (io), AY3 IO_L9P_MRCC_34 (io), AY4 IO_L12P_A03_D19_34 (io), AY5 IO_L12N_VRP_33 (io), AY7 IO_L11N_SRCC_33 (io), BA1 IO_L3N_A12_D28_34 (io), BA2 IO_L7P_A05_D21_34 (io), BA4 IO_L12N_A02_D18_34 (io), BA5 IO_L12P_VRN_33 (io), BA6 IO_L13N_33 (io), BB2 IO_L7N_A04_D20_34 (io), BB3 IO_L8N_SRCC_34 (io), BB4 IO_L8P_SRCC_34 (io), BB5 VCCO_33 (power), BB6 IO_L13P_33 (io)
part K pins: A5 IO_L14P_36 (io), A6 IO_L14N_VREF_36 (io), A7 IO_L8N_SRCC_36 (io), A8 VCCO_36 (power), A9 IO_L3P_36 (io), A10 IO_L3N_36 (io), A11 IO_L1P_36 (io), A12 IO_L1N_36 (io), B6 IO_L18N_36 (io), B7 IO_L8P_SRCC_36 (io), B8 IO_L9P_MRCC_36 (io), B9 IO_L9N_MRCC_36 (io), B11 IO_L7N_36 (io), B12 IO_L7P_36 (io), C6 IO_L18P_36 (io), C8 IO_L4P_36 (io), C9 IO_L4N_VREF_36 (io), C10 IO_L11N_SRCC_36 (io), C11 IO_L11P_SRCC_36 (io), C12 VCCO_36 (power), D6 IO_L1P_35 (io), D7 IO_L1N_35 (io), D8 IO_L6N_36 (io), D9 VCCO_36 (power), D10 IO_L0P_36 (io), D11 IO_L0N_36 (io), D12 IO_L5N_36 (io), E6 VCCO_35 (power), E7 IO_L5N_SM2N_35 (io), E8 IO_L6P_36 (io), E9 IO_L15P_36 (io), E10 IO_L15N_36 (io), E12 IO_L5P_36 (io), F6 IO_L6N_SM3N_35 (io), F7 IO_L5P_SM2P_35 (io), F9 IO_L0N_35 (io), F10 IO_L0P_35 (io), F11 IO_L19P_36 (io), F12 IO_L19N_36 (io), F13 VCCO_36 (power), G6 IO_L6P_SM3P_35 (io), G7 IO_L10P_MRCC_35 (io), G8 IO_L10N_MRCC_35 (io), G9 IO_L2N_SM0N_35 (io), G10 VCCO_35 (power), G11 IO_L2P_36 (io), G12 IO_L2N_36 (io), G13 IO_L17P_36 (io), G14 IO_L13N_36 (io), H7 VCCO_35 (power), H8 IO_L15N_SM7N_35 (io), H9 IO_L2P_SM0P_35 (io), H10 IO_L3N_SM1N_35 (io), H11 IO_L3P_SM1P_35 (io), H13 IO_L17N_36 (io), H14 IO_L13P_36 (io), J7 IO_L19N_GC_35 (io), J8 IO_L15P_SM7P_35 (io), J10 IO_L7P_SM4P_35 (io), J11 IO_L7N_SM4N_35 (io), J12 IO_L9N_MRCC_35 (io), J13 IO_L12P_VRN_36 (io), J14 VCCO_36 (power), J15 IO_L10P_MRCC_36 (io), J16 IO_L10N_MRCC_36 (io), K8 IO_L19P_GC_35 (io), K9 IO_L12N_SM5N_35 (io), K10 IO_L8P_SRCC_35 (io), K11 VCCO_35 (power), K12 IO_L11P_SRCC_35 (io), K13 IO_L9P_MRCC_35 (io), K14 IO_L12N_VRP_36 (io), K15 IO_L16N_36 (io), L10 IO_L12P_SM5P_35 (io), L11 IO_L8N_SRCC_35 (io), L12 IO_L11N_SRCC_35 (io), L14 IO_L4N_VREF_35 (io), L15 IO_L13N_SM6N_35 (io), L16 IO_L16P_36 (io), M12 IO_L14N_VREF_35 (io), M13 IO_L14P_35 (io), M14 IO_L4P_35 (io), M15 VCCO_35 (power), M16 IO_L13P_SM6P_35 (io), N14 IO_L16P_VRN_35 (io), N15 IO_L16N_VRP_35 (io), N16 IO_L17P_35 (io), P15 IO_L18N_GC_35 (io), P16 IO_L17N_35 (io), R15 IO_L18P_GC_35 (io)
part L pins: A14 IO_L1P_37 (io), A15 IO_L1N_37 (io), A16 IO_L18P_38 (io), A17 IO_L18N_38 (io), A18 VCCO_38 (power), A19 IO_L13P_38 (io), A20 IO_L13N_38 (io), A21 IO_L11N_SRCC_38 (io), B13 IO_L3P_37 (io), B14 IO_L3N_37 (io), B15 VCCO_37 (power), B16 IO_L16P_38 (io), B17 IO_L16N_38 (io), B18 IO_L14P_38 (io), B19 IO_L14N_VREF_38 (io), B21 IO_L11P_SRCC_38 (io), C13 IO_L12P_VRN_37 (io), C14 IO_L12N_VRP_37 (io), C15 IO_L11P_SRCC_37 (io), C16 IO_L7P_37 (io), C18 IO_L12P_VRN_38 (io), C19 IO_L12N_VRP_38 (io), C20 IO_L17P_38 (io), C21 IO_L9N_MRCC_38 (io), D13 IO_L0P_37 (io), D15 IO_L11N_SRCC_37 (io), D16 IO_L7N_37 (io), D17 IO_L10P_MRCC_38 (io), D18 IO_L10N_MRCC_38 (io), D19 VCCO_38 (power), D20 IO_L17N_38 (io), D21 IO_L9P_MRCC_38 (io), E13 IO_L0N_37 (io), E14 IO_L5P_37 (io), E15 IO_L5N_37 (io), E16 VCCO_37 (power), E17 IO_L6P_38 (io), E18 IO_L15N_38 (io), E19 IO_L5N_38 (io), E20 IO_L0N_38 (io), F14 IO_L6N_37 (io), F15 IO_L6P_37 (io), F16 IO_L10N_MRCC_37 (io), F17 IO_L6N_38 (io), F19 IO_L15P_38 (io), F20 IO_L5P_38 (io), F21 IO_L0P_38 (io), G16 IO_L10P_MRCC_37 (io), G17 IO_L13N_37 (io), G18 IO_L4P_38 (io), G19 IO_L19P_38 (io), G20 VCCO_38 (power), G21 IO_L3P_38 (io), H15 IO_L8P_SRCC_37 (io), H16 IO_L8N_SRCC_37 (io), H17 VCCO_37 (power), H18 IO_L13P_37 (io), H19 IO_L4N_VREF_38 (io), H20 IO_L19N_38 (io), H21 IO_L3N_38 (io), J17 IO_L2N_37 (io), J18 IO_L15N_37 (io), J20 IO_L2N_38 (io), J21 IO_L1N_38 (io), J22 IO_L1P_38 (io), K17 IO_L2P_37 (io), K18 IO_L15P_37 (io), K19 IO_L17P_37 (io), K20 IO_L2P_38 (io), K21 VCCO_38 (power), K22 IO_L7P_38 (io), L17 IO_L14N_VREF_37 (io), L18 VCCO_37 (power), L19 IO_L17N_37 (io), L20 IO_L8N_SRCC_38 (io), L21 IO_L8P_SRCC_38 (io), L22 IO_L7N_38 (io), M17 IO_L14P_37 (io), M18 IO_L19P_37 (io), M19 IO_L19N_37 (io), N18 IO_L16N_37 (io), N19 IO_L4N_VREF_37 (io), N20 IO_L9N_MRCC_37 (io), P17 IO_L16P_37 (io), P18 IO_L18N_37 (io), P19 VCCO_37 (power), P20 IO_L4P_37 (io), P21 IO_L9P_MRCC_37 (io), R17 IO_L18P_37 (io)
part M pins: AC10 IO_L2P_43 (io), AC11 IO_L2N_43 (io), AD5 IO_L0N_43 (io), AD6 IO_L0P_43 (io), AD7 IO_L9N_MRCC_43 (io), AD8 IO_L11P_SRCC_43 (io), AD9 VCCO_43 (power), AD10 IO_L13P_43 (io), AD11 IO_L13N_43 (io), AE4 IO_L4N_VREF_43 (io), AE5 IO_L5N_43 (io), AE6 VCCO_43 (power), AE7 IO_L9P_MRCC_43 (io), AE8 IO_L11N_SRCC_43 (io), AE9 IO_L17N_43 (io), AE10 IO_L17P_43 (io), AF1 IO_L1N_43 (io), AF2 IO_L3N_43 (io), AF3 VCCO_43 (power), AF4 IO_L4P_43 (io), AF5 IO_L5P_43 (io), AF6 IO_L15N_43 (io), AF7 IO_L15P_43 (io), AF9 IO_L8N_SRCC_43 (io), AF10 IO_L8P_SRCC_43 (io), AF11 IO_L19N_43 (io), AF12 IO_L19P_43 (io), AG1 IO_L1P_43 (io), AG2 IO_L3P_43 (io), AG3 IO_L14N_VREF_43 (io), AG4 IO_L10N_MRCC_43 (io), AG6 IO_L6N_43 (io), AG7 IO_L6P_43 (io), AG8 IO_L12N_VRP_43 (io), AG9 IO_L12P_VRN_43 (io), AG10 VCCO_43 (power), AG11 IO_L18N_43 (io), AG12 IO_L18P_43 (io), AH1 IO_L7P_43 (io), AH3 IO_L14P_43 (io), AH4 IO_L10P_MRCC_43 (io), AH5 IO_L0N_42 (io), AH6 IO_L0P_42 (io), AH7 VCCO_42 (power), AH8 IO_L19P_42 (io), AH9 IO_L14N_VREF_42 (io), AH10 IO_L14P_42 (io), AJ1 IO_L7N_43 (io), AJ2 IO_L16N_43 (io), AJ3 IO_L16P_43 (io), AJ4 VCCO_42 (power), AJ5 IO_L5N_42 (io), AJ6 IO_L5P_42 (io), AJ7 IO_L19N_42 (io), AJ8 IO_L15P_42 (io), AK1 VCCO_43 (power), AK2 IO_L1N_42 (io), AK3 IO_L3N_42 (io), AK4 IO_L6N_42 (io), AK5 IO_L10N_MRCC_42 (io), AK7 IO_L15N_42 (io), AL1 IO_L1P_42 (io), AL2 IO_L3P_42 (io), AL4 IO_L6P_42 (io), AL5 IO_L10P_MRCC_42 (io), AL6 IO_L18N_42 (io), AM1 IO_L7P_42 (io), AM2 IO_L7N_42 (io), AM3 IO_L13N_42 (io), AM4 IO_L13P_42 (io), AM5 VCCO_42 (power), AM6 IO_L18P_42 (io), AN1 IO_L9N_MRCC_42 (io), AN2 VCCO_42 (power), AN3 IO_L11N_SRCC_42 (io), AN4 IO_L17P_42 (io), AN5 IO_L17N_42 (io), AP1 IO_L9P_MRCC_42 (io), AP2 IO_L2N_42 (io), AP3 IO_L11P_SRCC_42 (io), AR2 IO_L2P_42 (io), AR3 IO_L16N_42 (io), AR4 IO_L16P_42 (io), AT1 IO_L4N_VREF_42 (io), AT2 IO_L4P_42 (io), AT3 VCCO_42 (power), AU1 IO_L8N_SRCC_42 (io), AU2 IO_L12N_VRP_42 (io), AU3 IO_L12P_VRN_42 (io), AV1 IO_L8P_SRCC_42 (io)